# Altium footprint library Footprints.PcbLib: 236 footprints (part 8 of 15)
Each footprint in its own frame and in the unit in brackets; x right, y up, seen from the top. Pads: shape width x height; smd on the part's side, far side on the other; paste and mask are expansions set on the pad; w line width, h text height; cw(c..) or ccw(c..) is an arc to the next point about the centre after c.
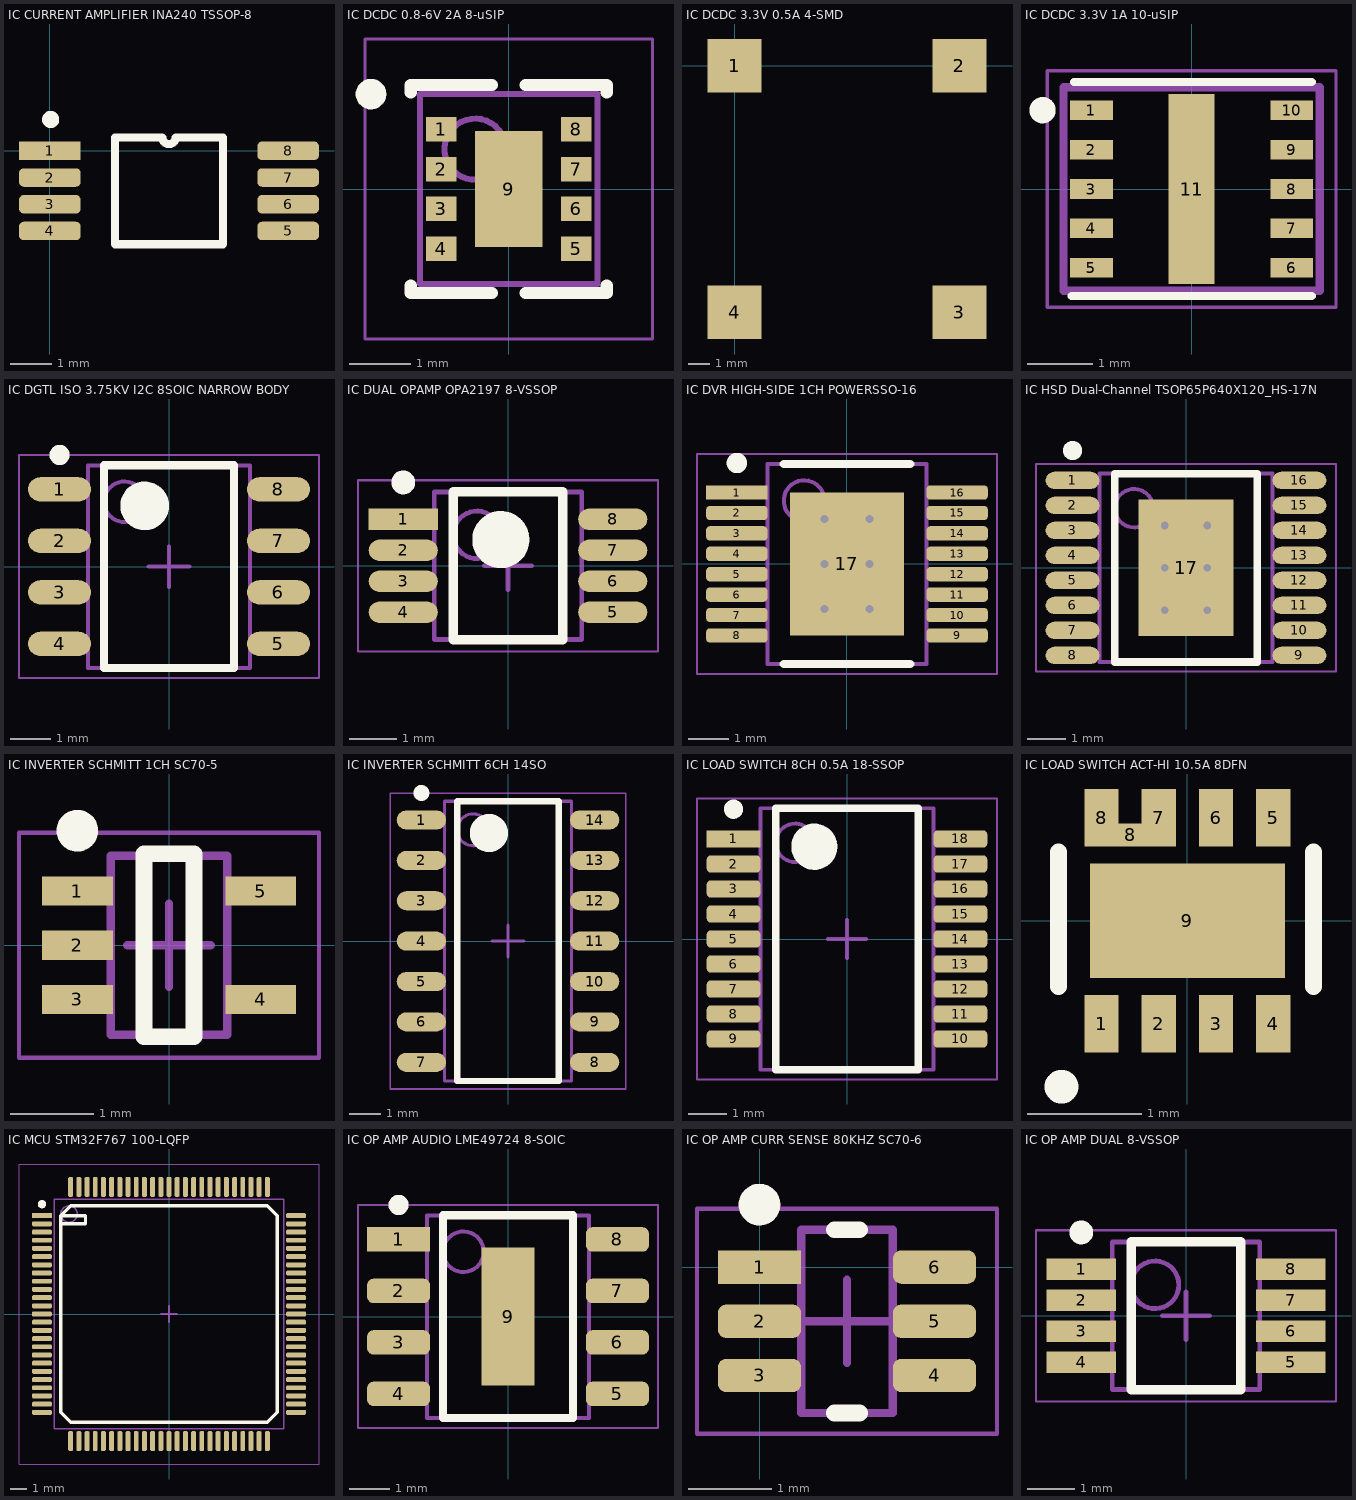
[diagram p7: the footprints below, top view; thin cyan lines are the x and y axes]

## IC CURRENT AMPLIFIER INA240 TSSOP-8 [mm]
pads (8):
  rect 1.5x0.45 smd: 1(0,0)
  rrect50% 1.5x0.45 smd: 2(0,-0.65) 3(0,-1.3) 4(0,-1.95) 5(5.8,-1.95) 6(5.8,-1.3) 7(5.8,-0.65) 8(5.8,0)
Top Overlay:
  lines w0.2: 1.585,-2.275 4.215,-2.275 4.215,0.325 3.062,0.325 cw(c2.9,0.325) 2.738,0.325 1.585,0.325 1.585,-2.275
  lines w0.254: 0.099,0.781 ccw(c0.021,0.762) 0.102,0.762
3D body "TSSOP-8.stp": height 1.2, standoff 0, extent -0.278,-2.515 6.222,0.585

## IC DCDC 0.8-6V 2A 8-uSIP [mm]
height 1.33
pads (9):
  rect 0.5x0.4 smd: 1(-1.1,0.975) 2(-1.1,0.325) 3(-1.1,-0.325) 4(-1.1,-0.975) 5(1.1,-0.975) 6(1.1,-0.325) 7(1.1,0.325) 8(1.1,0.975)
  rect 1.1x1.9 smd: 9(0,0)
Top Overlay:
  circle w0.25: c-2.25,1.55 r0.125
  lines w0.2: -1.6,-1.575 -1.6,-1.7 -0.275,-1.7 ; -1.6,1.575 -1.6,1.7 -0.275,1.7 ; 0.275,-1.7 1.6,-1.7 1.6,-1.575 ; 0.275,1.7 1.6,1.7 1.6,1.575
Assembly Top (Mech9):
  circle w0.1: c-0.55,0.65 r0.5
  lines w0.1: -1.45,-1.55 1.45,-1.55 1.45,1.55 -1.45,1.55 -1.45,-1.55
Courtyard Top (Mech11):
  lines w0.05: -2.35,-2.45 2.35,-2.45 2.35,2.45 -2.35,2.45 -2.35,-2.45
  lines w0.1: -0.5,0 0.5,0 ; 0,-0.5 0,0.5
3D body "SIL0008C.stp": height 1.31, standoff 0, extent -1.4,-1.5 1.4,1.5

## IC DCDC 3.3V 0.5A 4-SMD [mm] "ROF-78E3.3-0.5SMD-R"
height 4
pads (4):
  rect 2.5x2.5 smd: 1(0,0) 2(10.5,0) 3(10.5,-11.5) 4(0,-11.5)
3D body: height 4, standoff 0, extent -1,-12.5 11.5,1

## IC DCDC 3.3V 1A 10-uSIP [mm] "LMZM23601"
pads (11):
  rect 0.65x0.3 smd: 1(-1.525,1.2) 2(-1.525,0.6) 3(-1.525,0) 4(-1.525,-0.6) 5(-1.525,-1.2) 6(1.525,-1.2) 7(1.525,-0.6) 8(1.525,0) 9(1.525,0.6) 10(1.525,1.2)
  rect 0.7x2.9 smd: 11(0,0)
Top Overlay:
  circle w0.2: c-2.27,1.2 r0.1
  lines w0.127: -1.83,-1.63 1.83,-1.63 ; -1.79,1.63 1.83,1.63
Top Paste:
  region: -0.35,-0.416 -0.35,0.416 0.35,0.416 0.35,-0.416
  region: 0.35,-0.617 0.35,-1.45 -0.35,-1.45 -0.35,-0.617
  region: -0.35,0.617 -0.35,1.45 0.35,1.45 0.35,0.617
Top Solder:
  region: -0.415,-1.515 -0.415,1.515 0.415,1.515 0.415,-1.515
  region: 1.135,0.985 1.135,1.415 1.915,1.415 1.915,0.985
  region: 1.135,0.385 1.135,0.815 1.915,0.815 1.915,0.385
  region: 1.135,-0.215 1.135,0.215 1.915,0.215 1.915,-0.215
  region: 1.135,-0.815 1.135,-0.385 1.915,-0.385 1.915,-0.815
  region: 1.135,-1.415 1.135,-0.985 1.915,-0.985 1.915,-1.415
  region: -1.135,-0.985 -1.135,-1.415 -1.915,-1.415 -1.915,-0.985
  region: -1.135,-0.385 -1.135,-0.815 -1.915,-0.815 -1.915,-0.385
  region: -1.135,0.215 -1.135,-0.215 -1.915,-0.215 -1.915,0.215
  region: -1.135,0.815 -1.135,0.385 -1.915,0.385 -1.915,0.815
  region: -1.135,1.415 -1.135,0.985 -1.915,0.985 -1.915,1.415
Assembly Bottom:
  lines w0.127: -1.95,-1.55 1.95,-1.55 ; -1.95,-1.55 -1.95,1.55 ; -1.95,-1.55 1.95,-1.55 ; -1.95,-1.55 -1.95,1.55 ; -1.95,1.55 1.95,1.55 ; -1.95,1.55 1.95,1.55 ; 1.95,-1.55 1.95,1.55 ; 1.95,-1.55 1.95,1.55
Mechanical 16:
  lines w0.05: -2.2,-1.8 2.2,-1.8 2.2,1.8 -2.2,1.8 -2.2,-1.8
3D body "PLMZM23601SILR--3DModel-STEP-56544.STEP": height 1.58, standoff 0, extent -1.9,-1.5 1.9,1.5

## IC DGTL ISO 3.75KV I2C 8SOIC NARROW BODY [mm] "SOIC, 8-Leads, Body 4.90x3.90mm, Pitch 1.27mm, IPC Medium Density"
height 1.75
pads (8):
  oval 1.55x0.6 smd: 1(-2.7,1.905) 2(-2.7,0.635) 3(-2.7,-0.635) 4(-2.7,-1.905) 5(2.7,-1.905) 6(2.7,-0.635) 7(2.7,0.635) 8(2.7,1.905)
Top Overlay:
  circle w0.25: c-2.7,2.755 r0.125
  circle w0.6: c-0.6,1.5 r0.3
  lines w0.2: -1.6,-2.5 -1.6,2.5 1.6,2.5 1.6,-2.5 -1.6,-2.5
Mechanical 13:
  circle w0.1: c-1.1,1.6 r0.5
  lines w0.1: -2,-2.5 -2,2.5 2,2.5 2,-2.5 -2,-2.5
Mechanical 15:
  lines w0.05: -3.7,-2.75 -3.7,2.75 3.7,2.75 3.7,-2.75 -3.7,-2.75
  lines w0.1: -0.5,0 0.5,0 ; 0,-0.5 0,0.5
3D body "IC DGTL ISO 3.75KV I2C 8SOIC NARROW BODY.step": height 1.75, standoff 0, extent -3,-2.5 3,2.5

## IC DUAL OPAMP OPA2197 8-VSSOP [mm] "TSOP, 8-Leads, Body 3.00x3.00mm, Pitch 0.65mm, IPC Medium Density"
height 1.1
pads (8):
  rect 1.45x0.45 smd: 1(-2.2,0.975)
  oval 1.45x0.45 smd: 2(-2.2,0.325) 3(-2.2,-0.325) 4(-2.2,-0.975) 5(2.2,-0.975) 6(2.2,-0.325) 7(2.2,0.325) 8(2.2,0.975)
Top Overlay:
  circle w0.6: c-0.15,0.55 r0.3
  circle w0.25: c-2.2,1.75 r0.125
  lines w0.2: -1.15,-1.55 1.15,-1.55 1.15,1.55 -1.15,1.55 -1.15,-1.55
Assembly Top:
  circle w0.1: c-0.65,0.65 r0.5
  lines w0.1: -1.55,-1.55 1.55,-1.55 1.55,1.55 -1.55,1.55 -1.55,-1.55
Courtyard Top:
  lines w0.05: -3.15,-1.8 3.15,-1.8 3.15,1.8 -3.15,1.8 -3.15,-1.8
  lines w0.1: -0.5,0 0.5,0 ; 0,-0.5 0,0.5
3D body "IC DUAL OPAMP OPA2197 8-VSSOP.step": height 1.1, standoff 0, extent -2.45,-1.55 2.45,1.55

## IC DVR HIGH-SIDE 1CH POWERSSO-16 [mm] "SSOP, 16-Leads, Body 4.90x3.90mm, Pitch 0.50mm, Thermal Pad 3.50x2.80mm, IPC Medium Density"
height 1.7
pads (17):
  rect 1.5x0.35 smd: 1(-2.7,1.75)
  rrect50% 1.5x0.35 smd: 2(-2.7,1.25) 3(-2.7,0.75) 4(-2.7,0.25) 5(-2.7,-0.25) 6(-2.7,-0.75) 7(-2.7,-1.25) 8(-2.7,-1.75) 9(2.7,-1.75) 10(2.7,-1.25) 11(2.7,-0.75) 12(2.7,-0.25) 13(2.7,0.25) 14(2.7,0.75) 15(2.7,1.25) 16(2.7,1.75)
  rect 2.8x3.5 smd: 17(0,0)
via 0.55,-1.1 diameter 0.5 hole 0.2
via -0.55,-1.1 diameter 0.5 hole 0.2
via 0.55,0 diameter 0.5 hole 0.2
via -0.55,0 diameter 0.5 hole 0.2
via 0.55,1.1 diameter 0.5 hole 0.2
via -0.55,1.1 diameter 0.5 hole 0.2
Top Overlay:
  circle w0.25: c-2.7,2.475 r0.125
  lines w0.2: -1.55,-2.45 1.55,-2.45 ; -1.55,2.45 1.55,2.45
Mechanical 13:
  circle w0.1: c-1.05,1.55 r0.5
  lines w0.1: -1.95,-2.45 1.95,-2.45 1.95,2.45 -1.95,2.45 -1.95,-2.45
Mechanical 15:
  lines w0.05: -3.675,-2.7 3.675,-2.7 3.675,2.7 -3.675,2.7 -3.675,-2.7
  lines w0.1: -0.5,0 0.5,0 ; 0,-0.5 0,0.5
3D body "IC DVR HIGH-SIDE 1CH POWERSSO-16.step": height 1.7, standoff 0, extent -3,-2.45 3,2.45

## IC HSD Dual-Channel TSOP65P640X120_HS-17N [mm] "TSOP, 16-Leads, Body 5.00x4.40mm, Pitch 0.65mm, Thermal Pad 3.55x2.46mm, IPC Medium Density"
height 1.2
pads (17):
  oval 1.4x0.45 smd: 1(-2.95,2.275) 2(-2.95,1.625) 3(-2.95,0.975) 4(-2.95,0.325) 5(-2.95,-0.325) 6(-2.95,-0.975) 7(-2.95,-1.625) 8(-2.95,-2.275) 9(2.95,-2.275) 10(2.95,-1.625) 11(2.95,-0.975) 12(2.95,-0.325) 13(2.95,0.325) 14(2.95,0.975) 15(2.95,1.625) 16(2.95,2.275)
  rect 2.46x3.55 smd: 17(0,0)
via -0.55,1.1 diameter 0.5 hole 0.2
via 0.55,1.1 diameter 0.5 hole 0.2
via -0.55,0 diameter 0.5 hole 0.2
via 0.55,0 diameter 0.5 hole 0.2
via -0.55,-1.1 diameter 0.5 hole 0.2
via 0.55,-1.1 diameter 0.5 hole 0.2
Top Overlay:
  circle w0.25: c-2.95,3.05 r0.125
  lines w0.2: -1.85,-2.45 -1.85,2.45 1.85,2.45 1.85,-2.45 -1.85,-2.45
Mechanical 13:
  circle w0.1: c-1.35,1.55 r0.5
  lines w0.1: -2.25,-2.45 -2.25,2.45 2.25,2.45 2.25,-2.45 -2.25,-2.45
Mechanical 15:
  lines w0.05: -3.9,-2.7 -3.9,2.7 3.9,2.7 3.9,-2.7 -3.9,-2.7
  lines w0.1: -0.5,0 0.5,0 ; 0,-0.5 0,0.5
3D body "TSOP65P640X120_HS-17N.step": height 1.2, standoff 0, extent -3.2,-2.45 3.2,2.45

## IC INVERTER SCHMITT 1CH SC70-5 [mm] "Inverter IC 1 Channel Schmitt Trigger SC-70-5"
height 1.1
pads (5):
  rect 0.85x0.35 smd: 1(-1.1,0.65) 2(-1.1,0) 3(-1.1,-0.65) 4(1.1,-0.65) 5(1.1,0.65)
Top Overlay:
  circle w0.25: c-1.1,1.375 r0.125
  lines w0.2: -0.3,-1.1 0.3,-1.1 0.3,1.1 -0.3,1.1 -0.3,-1.1
Assembly Top:
  lines w0.1: -0.7,-1.075 -0.7,1.075 0.7,1.075 0.7,-1.075 -0.7,-1.075
Courtyard Top:
  lines w0.05: -1.8,-1.35 -1.8,1.35 1.8,1.35 1.8,-1.35 -1.8,-1.35
  lines w0.1: -0.5,0 0.5,0 ; 0,-0.5 0,0.5
3D body "IC INVERTER SCHMITT 1CH SC70-5.step": height 1.1, standoff 0, extent -1.2,-1.075 1.2,1.075

## IC INVERTER SCHMITT 6CH 14SO [mm] "Inverter IC 6 Channel Schmitt Trigger 14-SO"
height 1.75
pads (14):
  oval 1.55x0.6 smd: 1(-2.725,3.81) 2(-2.725,2.54) 3(-2.725,1.27) 4(-2.725,0) 5(-2.725,-1.27) 6(-2.725,-2.54) 7(-2.725,-3.81) 8(2.725,-3.81) 9(2.725,-2.54) 10(2.725,-1.27) 11(2.725,0) 12(2.725,1.27) 13(2.725,2.54) 14(2.725,3.81)
Top Overlay:
  circle w0.6: c-0.6,3.4 r0.3
  circle w0.25: c-2.725,4.66 r0.125
  lines w0.2: -1.6,-4.4 1.6,-4.4 1.6,4.4 -1.6,4.4 -1.6,-4.4
Assembly Top (Mech9):
  circle w0.1: c-1.1,3.5 r0.5
  lines w0.1: -2,-4.4 2,-4.4 2,4.4 -2,4.4 -2,-4.4
Courtyard Top (Mech11):
  lines w0.05: -3.7,-4.65 3.7,-4.65 3.7,4.65 -3.7,4.65 -3.7,-4.65
  lines w0.1: -0.5,0 0.5,0 ; 0,-0.5 0,0.5
3D body "IC INVERTER SCHMITT 6CH 14SO .step": height 1.75, standoff 0, extent -3,-4.4 3,4.4

## IC LOAD SWITCH 8CH 0.5A 18-SSOP [mm] "TSOP, 18-Leads, Body 6.70x4.40mm, Pitch 0.65mm, IPC Medium Density"
height 1.55
pads (18):
  rect 1.4x0.45 smd: 1(-2.95,2.6)
  rrect50% 1.4x0.45 smd: 2(-2.95,1.95) 3(-2.95,1.3) 4(-2.95,0.65) 5(-2.95,0) 6(-2.95,-0.65) 7(-2.95,-1.3) 8(-2.95,-1.95) 9(-2.95,-2.6) 10(2.95,-2.6) 11(2.95,-1.95) 12(2.95,-1.3) 13(2.95,-0.65) 14(2.95,0) 15(2.95,0.65) 16(2.95,1.3) 17(2.95,1.95) 18(2.95,2.6)
Top Overlay:
  circle w0.25: c-2.95,3.375 r0.125
  circle w0.6: c-0.85,2.4 r0.3
  lines w0.2: -1.85,-3.4 -1.85,3.4 1.85,3.4 1.85,-3.4 -1.85,-3.4
Assembly Top:
  circle w0.1: c-1.35,2.5 r0.5
  lines w0.1: -2.25,-3.4 -2.25,3.4 2.25,3.4 2.25,-3.4 -2.25,-3.4
Courtyard Top:
  lines w0.05: -3.9,-3.65 -3.9,3.65 3.9,3.65 3.9,-3.65 -3.9,-3.65
  lines w0.1: -0.5,0 0.5,0 ; 0,-0.5 0,0.5
3D body "IC LOAD SWITCH 8CH 0.5A 18-SSOP.step": height 1.55, standoff 0, extent -3.2,-3.4 3.2,3.4

## IC LOAD SWITCH ACT-HI 10.5A 8DFN [mm]
pads (10):
  rect 0.3x0.5 smd: 1(-0.75,-0.9) 2(-0.25,-0.9) 3(0.25,-0.9) 4(0.75,-0.9) 5(0.75,0.9) 6(0.25,0.9) 7(-0.25,0.9) 8(-0.75,0.9)
  rect 0.8x0.2 smd paste+0 mask+0: 8(-0.5,0.75)
  rect 1.7x1 smd: 9(0,0)
Top Overlay:
  circle w0.254: c-1.1,-1.45 r0.02
  lines w0.15: -1.125,-0.575 -1.125,0.6 ; 1.1,-0.575 1.1,0.6
3D body "QFN50P200X200X100_HS-9N.step": height 1, standoff 0, extent -1,-1.05 1,1.05

## IC MCU STM32F767 100-LQFP [mm] "CQFP, 100-Leads, Body 16.00x16.00mm, Pitch 0.50mm, IPC Low Density"
height 1.6
pads (100):
  rect 1.2x0.3 smd: 1(-7.75,6)
  rrect50% 1.2x0.3 smd: 2(-7.75,5.5) 3(-7.75,5) 4(-7.75,4.5) 5(-7.75,4) 6(-7.75,3.5) 7(-7.75,3) 8(-7.75,2.5) 9(-7.75,2) 10(-7.75,1.5) 11(-7.75,1) 12(-7.75,0.5) 13(-7.75,0) 14(-7.75,-0.5) 15(-7.75,-1) 16(-7.75,-1.5) 17(-7.75,-2) 18(-7.75,-2.5) 19(-7.75,-3) 20(-7.75,-3.5) 21(-7.75,-4) 22(-7.75,-4.5) 23(-7.75,-5) 24(-7.75,-5.5) 25(-7.75,-6) 51(7.75,-6) 52(7.75,-5.5) 53(7.75,-5) 54(7.75,-4.5) 55(7.75,-4) 56(7.75,-3.5) 57(7.75,-3) 58(7.75,-2.5) 59(7.75,-2) 60(7.75,-1.5) 61(7.75,-1) 62(7.75,-0.5) 63(7.75,0) 64(7.75,0.5) 65(7.75,1) 66(7.75,1.5) 67(7.75,2) 68(7.75,2.5) 69(7.75,3) 70(7.75,3.5) 71(7.75,4) 72(7.75,4.5) 73(7.75,5) 74(7.75,5.5) 75(7.75,6)
  rrect50% 0.3x1.2 smd: 26(-6,-7.75) 27(-5.5,-7.75) 28(-5,-7.75) 29(-4.5,-7.75) 30(-4,-7.75) 31(-3.5,-7.75) 32(-3,-7.75) 33(-2.5,-7.75) 34(-2,-7.75) 35(-1.5,-7.75) 36(-1,-7.75) 37(-0.5,-7.75) 38(0,-7.75) 39(0.5,-7.75) 40(1,-7.75) 41(1.5,-7.75) 42(2,-7.75) 43(2.5,-7.75) 44(3,-7.75) 45(3.5,-7.75) 46(4,-7.75) 47(4.5,-7.75) 48(5,-7.75) 49(5.5,-7.75) 50(6,-7.75) 76(6,7.75) 77(5.5,7.75) 78(5,7.75) 79(4.5,7.75) 80(4,7.75) 81(3.5,7.75) 82(3,7.75) 83(2.5,7.75) 84(2,7.75) 85(1.5,7.75) 86(1,7.75) 87(0.5,7.75) 88(0,7.75) 89(-0.5,7.75) 90(-1,7.75) 91(-1.5,7.75) 92(-2,7.75) 93(-2.5,7.75) 94(-3,7.75) 95(-3.5,7.75) 96(-4,7.75) 97(-4.5,7.75) 98(-5,7.75) 99(-5.5,7.75) 100(-6,7.75)
Top Overlay:
  circle w0.25: c-7.75,6.7 r0.125
  lines w0.2: -6.6,5.5 -5.1,5.5 -5.1,6 -6.6,6 ; -6.6,6 -6,6.6 6,6.6 6.6,6 6.6,-6 6,-6.6 -6,-6.6 -6.6,-6 -6.6,6
Assembly Top (Mech9):
  circle w0.1: c-6.1,6.1 r0.5
  lines w0.1: -7,-7 7,-7 7,7 -7,7 -7,-7
Courtyard Top (Mech11):
  lines w0.05: -9.15,-9.15 9.15,-9.15 9.15,9.15 -9.15,9.15 -9.15,-9.15
  lines w0.1: -0.5,0 0.5,0 ; 0,-0.5 0,0.5
3D body "IC MCU STM32F767 100-LQFP.step": height 1.55, standoff 0, extent -8.1,-8.1 8.1,8.1

## IC OP AMP AUDIO LME49724 8-SOIC [mm]
height 1.7
pads (9):
  rect 1.55x0.6 smd: 1(-2.7,1.905)
  rrect50% 1.55x0.6 smd: 2(-2.7,0.635) 3(-2.7,-0.635) 4(-2.7,-1.905) 5(2.7,-1.905) 6(2.7,-0.635) 7(2.7,0.635) 8(2.7,1.905)
  rect 1.3x3.4 smd: 9(0,0)
Top Overlay:
  circle w0.25: c-2.7,2.755 r0.125
  lines w0.2: -1.6,-2.5 1.6,-2.5 1.6,2.5 -1.6,2.5 -1.6,-2.5
Assembly Top (Mech9):
  circle w0.1: c-1.1,1.6 r0.5
  lines w0.1: -2,-2.5 2,-2.5 2,2.5 -2,2.5 -2,-2.5
Courtyard Top (Mech11):
  lines w0.05: -3.7,-2.75 3.7,-2.75 3.7,2.75 -3.7,2.75 -3.7,-2.75
  lines w0.1: -0.5,0 0.5,0 ; 0,-0.5 0,0.5
3D body "IC OP AMP AUDIO LME49724 8-SOIC.step": height 1.7, standoff 0, extent -3,-2.5 3,2.5

## IC OP AMP CURR SENSE 80KHZ SC70-6 [mm]
height 1.1
pads (6):
  rect 1x0.4 smd: 1(0,0)
  rrect50% 1x0.4 smd: 2(0,-0.65) 3(0,-1.3) 4(2.1,-1.3) 5(2.1,-0.65) 6(2.1,0)
Top Overlay:
  circle w0.25: c0,0.75 r0.125
  lines w0.2: 0.9,-1.75 1.2,-1.75 ; 0.9,0.45 1.2,0.45
Mechanical 13:
  lines w0.1: 0.5,-1.75 0.5,0.45 1.6,0.45 1.6,-1.75 0.5,-1.75
Mechanical 15:
  lines w0.05: -0.75,-2 -0.75,0.7 2.85,0.7 2.85,-2 -0.75,-2
  lines w0.1: 0.55,-0.65 1.55,-0.65 ; 1.05,-1.15 1.05,-0.15
3D body "IC OP AMP CURR SENSE 80KHZ SC70-6.step": height 1.1, standoff 0, extent 0,-1.75 2.1,0.45

## IC OP AMP DUAL 8-VSSOP [mm] "VSSOP 8-Leads, Body 3.00x3.00mm, Pitch 0.65mm, IPC Medium Density"
height 1.1
pads (8):
  rect 1.45x0.45 smd: 1(-2.2,0.975) 2(-2.2,0.325) 3(-2.2,-0.325) 4(-2.2,-0.975) 5(2.2,-0.975) 6(2.2,-0.325) 7(2.2,0.325) 8(2.2,0.975)
Top Overlay:
  circle w0.25: c-2.2,1.75 r0.125
  lines w0.2: -1.15,-1.55 -1.15,1.55 1.15,1.55 1.15,-1.55 -1.15,-1.55
Mechanical 13:
  circle w0.1: c-0.65,0.65 r0.5
  lines w0.1: -1.55,-1.55 -1.55,1.55 1.55,1.55 1.55,-1.55 -1.55,-1.55
Mechanical 15:
  lines w0.05: -3.15,-1.8 -3.15,1.8 3.15,1.8 3.15,-1.8 -3.15,-1.8
  lines w0.1: -0.5,0 0.5,0 ; 0,-0.5 0,0.5
3D body: height 1.1, standoff 0.05, extent -1.55,-1.55 1.55,1.55